# Altium footprint library connectors_socets.pcblib: 601 footprints (part 30 of 38)
Each footprint in its own frame and in the unit in brackets; x right, y up, seen from the top. Pads: shape width x height; smd on the part's side, far side on the other; paste and mask are expansions set on the pad; w line width, h text height; cw(c..) or ccw(c..) is an arc to the next point about the centre after c.
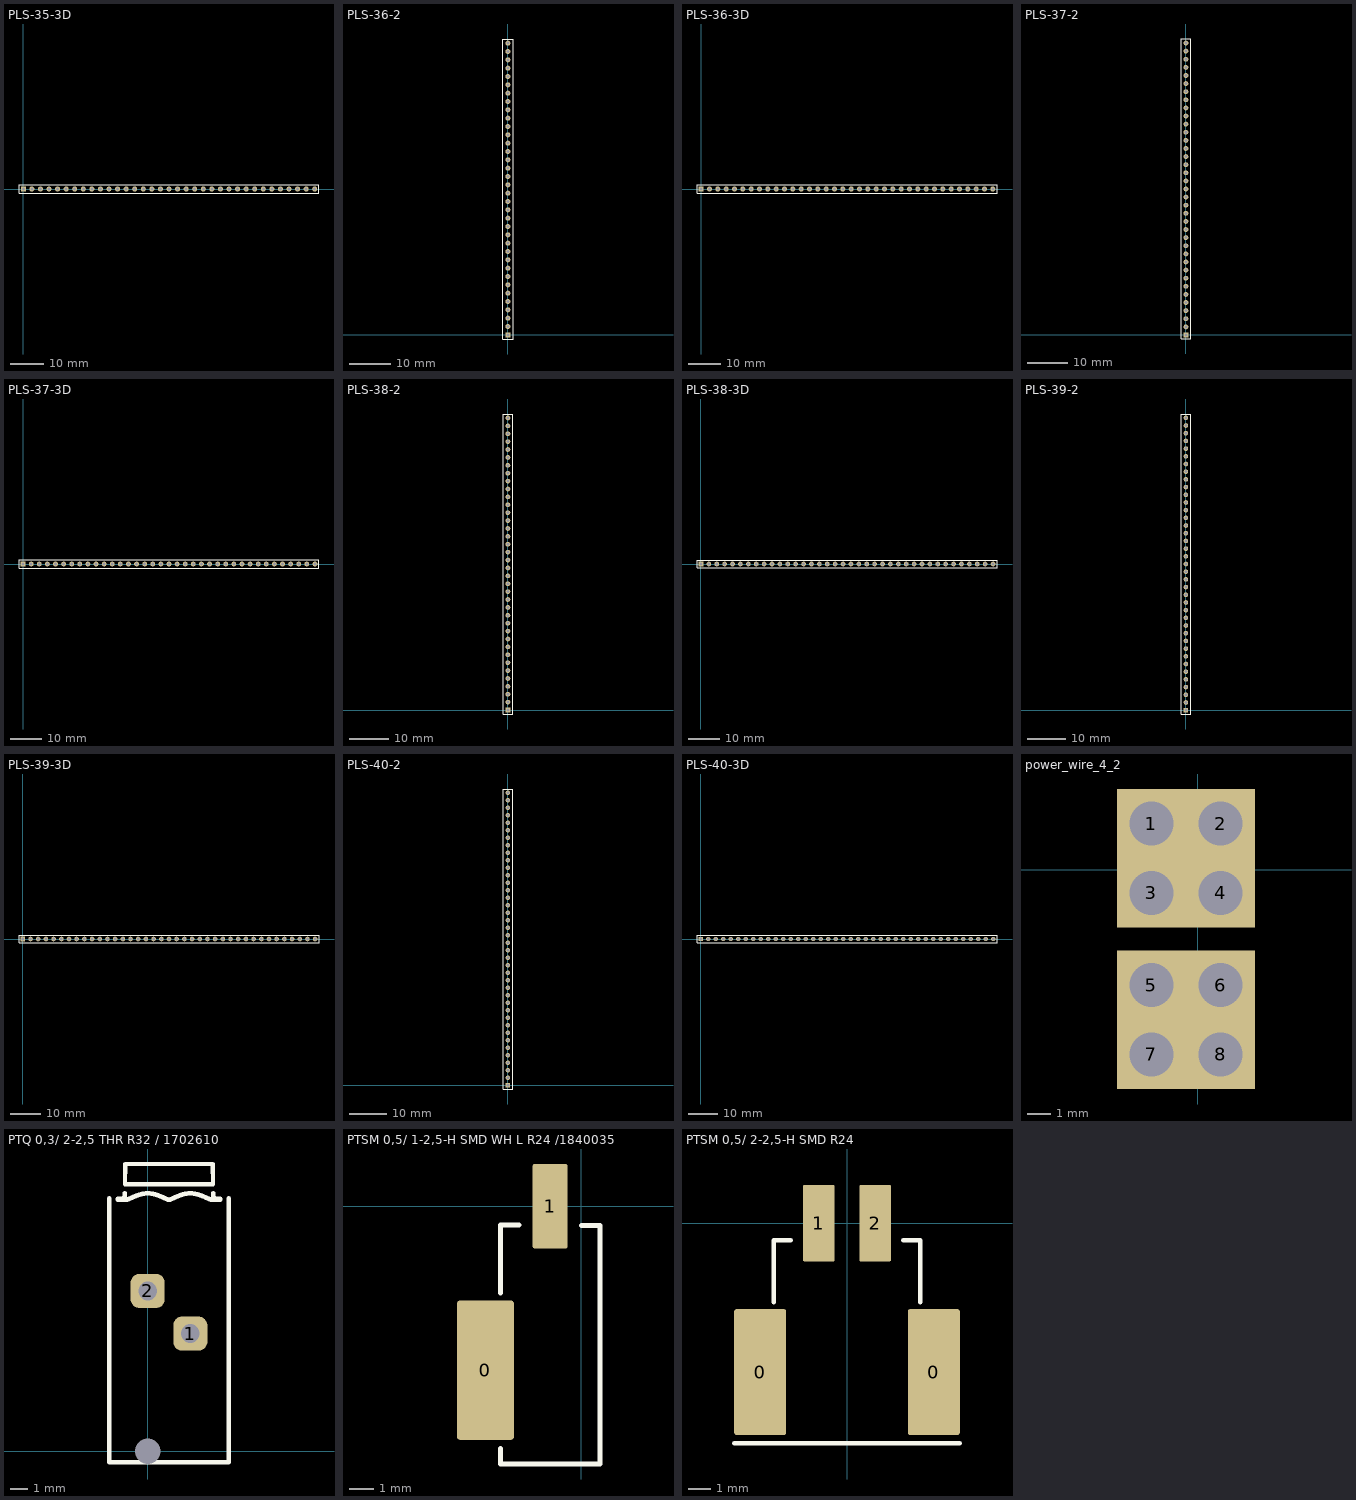
[diagram p29: the footprints below, top view; thin cyan lines are the x and y axes]

## PLS-35-3D [mm] "Connector; Header; 35 Position"
height 7.5
pads (35):
  rect 1.5x1.5 hole 0.9: 1(0,0)
  round 1.5 hole 0.9: 2(2.54,0) 3(5.08,0) 4(7.62,0) 5(10.16,0) 6(12.7,0) 7(15.24,0) 8(17.78,0) 9(20.32,0) 10(22.86,0) 11(25.4,0) 12(27.94,0) 13(30.48,0) 14(33.02,0) 15(35.56,0) 16(38.1,0) 17(40.64,0) 18(43.18,0) 19(45.72,0) 20(48.26,0) 21(50.8,0) 22(53.34,0) 23(55.88,0) 24(58.42,0) 25(60.96,0) 26(63.5,0) 27(66.04,0) 28(68.58,0) 29(71.12,0) 30(73.66,0) 31(76.2,0) 32(78.74,0) 33(81.28,0) 34(83.82,0) 35(86.36,0)
Top Overlay:
  lines w0.2: -1.27,-1.27 -1.27,1.27 87.63,1.27 87.63,-1.27 -1.27,-1.27
3D body "PLS-1.step": height 8.44, standoff -3, extent -1.27,-1.27 1.27,1.27
3D body "PLS-1.step": height 8.44, standoff -3, extent 1.27,-1.27 3.81,1.27
3D body "PLS-1.step": height 8.44, standoff -3, extent 3.81,-1.27 6.35,1.27
3D body "PLS-1.step": height 8.44, standoff -3, extent 6.35,-1.27 8.89,1.27
3D body "PLS-1.step": height 8.44, standoff -3, extent 8.89,-1.27 11.43,1.27
3D body "PLS-1.step": height 8.44, standoff -3, extent 11.43,-1.27 13.97,1.27
3D body "PLS-1.step": height 8.44, standoff -3, extent 13.97,-1.27 16.51,1.27
3D body "PLS-1.step": height 8.44, standoff -3, extent 16.51,-1.27 19.05,1.27
3D body "PLS-1.step": height 8.44, standoff -3, extent 19.05,-1.27 21.59,1.27
3D body "PLS-1.step": height 8.44, standoff -3, extent 21.59,-1.27 24.13,1.27
3D body "PLS-1.step": height 8.44, standoff -3, extent 24.13,-1.27 26.67,1.27
3D body "PLS-1.step": height 8.44, standoff -3, extent 26.67,-1.27 29.21,1.27
3D body "PLS-1.step": height 8.44, standoff -3, extent 29.21,-1.27 31.75,1.27
3D body "PLS-1.step": height 8.44, standoff -3, extent 31.75,-1.27 34.29,1.27
3D body "PLS-1.step": height 8.44, standoff -3, extent 34.29,-1.27 36.83,1.27
3D body "PLS-1.step": height 8.44, standoff -3, extent 36.83,-1.27 39.37,1.27
3D body "PLS-1.step": height 8.44, standoff -3, extent 39.37,-1.27 41.91,1.27
3D body "PLS-1.step": height 8.44, standoff -3, extent 41.91,-1.27 44.45,1.27
3D body "PLS-1.step": height 8.44, standoff -3, extent 44.45,-1.27 46.99,1.27
3D body "PLS-1.step": height 8.44, standoff -3, extent 46.99,-1.27 49.53,1.27
3D body "PLS-1.step": height 8.44, standoff -3, extent 49.53,-1.27 52.07,1.27
3D body "PLS-1.step": height 8.44, standoff -3, extent 52.07,-1.27 54.61,1.27
3D body "PLS-1.step": height 8.44, standoff -3, extent 54.61,-1.27 57.15,1.27
3D body "PLS-1.step": height 8.44, standoff -3, extent 57.15,-1.27 59.69,1.27
3D body "PLS-1.step": height 8.44, standoff -3, extent 59.69,-1.27 62.23,1.27
3D body "PLS-1.step": height 8.44, standoff -3, extent 62.23,-1.27 64.77,1.27
3D body "PLS-1.step": height 8.44, standoff -3, extent 64.77,-1.27 67.31,1.27
3D body "PLS-1.step": height 8.44, standoff -3, extent 67.31,-1.27 69.85,1.27
3D body "PLS-1.step": height 8.44, standoff -3, extent 69.85,-1.27 72.39,1.27
3D body "PLS-1.step": height 8.44, standoff -3, extent 72.39,-1.27 74.93,1.27
3D body "PLS-1.step": height 8.44, standoff -3, extent 74.93,-1.27 77.47,1.27
3D body "PLS-1.step": height 8.44, standoff -3, extent 77.47,-1.27 80.01,1.27
3D body "PLS-1.step": height 8.44, standoff -3, extent 80.01,-1.27 82.55,1.27
3D body "PLS-1.step": height 8.44, standoff -3, extent 82.55,-1.27 85.09,1.27
3D body "PLS-1.step": height 8.44, standoff -3, extent 85.09,-1.27 87.63,1.27

## PLS-36-2 [mm] "Connector; Header; 1x36 Position"
height 6
pads (36):
  rect 1.2x1.2 hole 0.75: 1(0,0)
  round 1.2 hole 0.75: 2(0,2) 3(0,4) 4(0,6) 5(0,8)
  round 1.2 hole 0.75 unplated: 6(0,10) 7(0,12) 8(0,14) 9(0,16) 10(0,18) 11(0,20) 12(0,22) 13(0,24) 14(0,26) 15(0,28) 16(0,30) 17(0,32) 18(0,34) 19(0,36) 20(0,38) 21(0,40) 22(0,42) 23(0,44) 24(0,46) 25(0,48) 26(0,50) 27(0,52) 28(0,54) 29(0,56) 30(0,58) 31(0,60) 32(0,62) 33(0,64) 34(0,66) 35(0,68) 36(0,70)
Top Overlay:
  lines w0.2: -1.2,-1 1.25,-1 1.25,71 -1.2,71 -1.2,-1
3D body "pls-2mm.stp": height 5.5, standoff -2.5, extent -1.2,7 1.2,9
3D body "pls-2mm.stp": height 5.5, standoff -2.5, extent -1.2,5 1.2,7
3D body "pls-2mm.stp": height 5.5, standoff -2.5, extent -1.2,3 1.2,5
3D body "pls-2mm.stp": height 5.5, standoff -2.5, extent -1.2,1 1.2,3
3D body "pls-2mm.stp": height 5.5, standoff -2.5, extent -1.2,-1 1.2,1
3D body "pls-2mm.stp": height 5.5, standoff -2.5, extent -1.2,9 1.2,11
3D body "pls-2mm.stp": height 5.5, standoff -2.5, extent -1.2,11 1.2,13
3D body "pls-2mm.stp": height 5.5, standoff -2.5, extent -1.2,13 1.2,15
3D body "pls-2mm.stp": height 5.5, standoff -2.5, extent -1.2,15 1.2,17
3D body "pls-2mm.stp": height 5.5, standoff -2.5, extent -1.2,17 1.2,19
3D body "pls-2mm.stp": height 5.5, standoff -2.5, extent -1.2,19 1.2,21
3D body "pls-2mm.stp": height 5.5, standoff -2.5, extent -1.2,21 1.2,23
3D body "pls-2mm.stp": height 5.5, standoff -2.5, extent -1.2,23 1.2,25
3D body "pls-2mm.stp": height 5.5, standoff -2.5, extent -1.2,25 1.2,27
3D body "pls-2mm.stp": height 5.5, standoff -2.5, extent -1.2,27 1.2,29
3D body "pls-2mm.stp": height 5.5, standoff -2.5, extent -1.2,29 1.2,31
3D body "pls-2mm.stp": height 5.5, standoff -2.5, extent -1.2,31 1.2,33
3D body "pls-2mm.stp": height 5.5, standoff -2.5, extent -1.2,33 1.2,35
3D body "pls-2mm.stp": height 5.5, standoff -2.5, extent -1.2,35 1.2,37
3D body "pls-2mm.stp": height 5.5, standoff -2.5, extent -1.2,37 1.2,39
3D body "pls-2mm.stp": height 5.5, standoff -2.5, extent -1.2,39 1.2,41
3D body "pls-2mm.stp": height 5.5, standoff -2.5, extent -1.2,41 1.2,43
3D body "pls-2mm.stp": height 5.5, standoff -2.5, extent -1.2,43 1.2,45
3D body "pls-2mm.stp": height 5.5, standoff -2.5, extent -1.2,45 1.2,47
3D body "pls-2mm.stp": height 5.5, standoff -2.5, extent -1.2,47 1.2,49
3D body "pls-2mm.stp": height 5.5, standoff -2.5, extent -1.2,49 1.2,51
3D body "pls-2mm.stp": height 5.5, standoff -2.5, extent -1.2,51 1.2,53
3D body "pls-2mm.stp": height 5.5, standoff -2.5, extent -1.2,53 1.2,55
3D body "pls-2mm.stp": height 5.5, standoff -2.5, extent -1.2,55 1.2,57
3D body "pls-2mm.stp": height 5.5, standoff -2.5, extent -1.2,57 1.2,59
3D body "pls-2mm.stp": height 5.5, standoff -2.5, extent -1.2,59 1.2,61
3D body "pls-2mm.stp": height 5.5, standoff -2.5, extent -1.2,61 1.2,63
3D body "pls-2mm.stp": height 5.5, standoff -2.5, extent -1.2,63 1.2,65
3D body "pls-2mm.stp": height 5.5, standoff -2.5, extent -1.2,65 1.2,67
3D body "pls-2mm.stp": height 5.5, standoff -2.5, extent -1.2,67 1.2,69
3D body "pls-2mm.stp": height 5.5, standoff -2.5, extent -1.2,69 1.2,71

## PLS-36-3D [mm] "Connector; Header; 36 Position"
height 7.5
pads (36):
  rect 1.5x1.5 hole 0.9: 1(0,0)
  round 1.5 hole 0.9: 2(2.54,0) 3(5.08,0) 4(7.62,0) 5(10.16,0) 6(12.7,0) 7(15.24,0) 8(17.78,0) 9(20.32,0) 10(22.86,0) 11(25.4,0) 12(27.94,0) 13(30.48,0) 14(33.02,0) 15(35.56,0) 16(38.1,0) 17(40.64,0) 18(43.18,0) 19(45.72,0) 20(48.26,0) 21(50.8,0) 22(53.34,0) 23(55.88,0) 24(58.42,0) 25(60.96,0) 26(63.5,0) 27(66.04,0) 28(68.58,0) 29(71.12,0) 30(73.66,0) 31(76.2,0) 32(78.74,0) 33(81.28,0) 34(83.82,0) 35(86.36,0) 36(88.9,0)
Top Overlay:
  lines w0.2: -1.27,-1.27 90.17,-1.27 90.17,1.27 -1.27,1.27 -1.27,-1.27
3D body "PLS-1.step": height 8.44, standoff -3, extent 87.63,-1.27 90.17,1.27
3D body "PLS-1.step": height 8.44, standoff -3, extent -1.27,-1.27 1.27,1.27
3D body "PLS-1.step": height 8.44, standoff -3, extent 1.27,-1.27 3.81,1.27
3D body "PLS-1.step": height 8.44, standoff -3, extent 3.81,-1.27 6.35,1.27
3D body "PLS-1.step": height 8.44, standoff -3, extent 6.35,-1.27 8.89,1.27
3D body "PLS-1.step": height 8.44, standoff -3, extent 8.89,-1.27 11.43,1.27
3D body "PLS-1.step": height 8.44, standoff -3, extent 11.43,-1.27 13.97,1.27
3D body "PLS-1.step": height 8.44, standoff -3, extent 13.97,-1.27 16.51,1.27
3D body "PLS-1.step": height 8.44, standoff -3, extent 16.51,-1.27 19.05,1.27
3D body "PLS-1.step": height 8.44, standoff -3, extent 19.05,-1.27 21.59,1.27
3D body "PLS-1.step": height 8.44, standoff -3, extent 21.59,-1.27 24.13,1.27
3D body "PLS-1.step": height 8.44, standoff -3, extent 24.13,-1.27 26.67,1.27
3D body "PLS-1.step": height 8.44, standoff -3, extent 26.67,-1.27 29.21,1.27
3D body "PLS-1.step": height 8.44, standoff -3, extent 29.21,-1.27 31.75,1.27
3D body "PLS-1.step": height 8.44, standoff -3, extent 31.75,-1.27 34.29,1.27
3D body "PLS-1.step": height 8.44, standoff -3, extent 34.29,-1.27 36.83,1.27
3D body "PLS-1.step": height 8.44, standoff -3, extent 36.83,-1.27 39.37,1.27
3D body "PLS-1.step": height 8.44, standoff -3, extent 39.37,-1.27 41.91,1.27
3D body "PLS-1.step": height 8.44, standoff -3, extent 41.91,-1.27 44.45,1.27
3D body "PLS-1.step": height 8.44, standoff -3, extent 44.45,-1.27 46.99,1.27
3D body "PLS-1.step": height 8.44, standoff -3, extent 46.99,-1.27 49.53,1.27
3D body "PLS-1.step": height 8.44, standoff -3, extent 49.53,-1.27 52.07,1.27
3D body "PLS-1.step": height 8.44, standoff -3, extent 52.07,-1.27 54.61,1.27
3D body "PLS-1.step": height 8.44, standoff -3, extent 54.61,-1.27 57.15,1.27
3D body "PLS-1.step": height 8.44, standoff -3, extent 57.15,-1.27 59.69,1.27
3D body "PLS-1.step": height 8.44, standoff -3, extent 59.69,-1.27 62.23,1.27
3D body "PLS-1.step": height 8.44, standoff -3, extent 62.23,-1.27 64.77,1.27
3D body "PLS-1.step": height 8.44, standoff -3, extent 64.77,-1.27 67.31,1.27
3D body "PLS-1.step": height 8.44, standoff -3, extent 67.31,-1.27 69.85,1.27
3D body "PLS-1.step": height 8.44, standoff -3, extent 69.85,-1.27 72.39,1.27
3D body "PLS-1.step": height 8.44, standoff -3, extent 72.39,-1.27 74.93,1.27
3D body "PLS-1.step": height 8.44, standoff -3, extent 74.93,-1.27 77.47,1.27
3D body "PLS-1.step": height 8.44, standoff -3, extent 77.47,-1.27 80.01,1.27
3D body "PLS-1.step": height 8.44, standoff -3, extent 80.01,-1.27 82.55,1.27
3D body "PLS-1.step": height 8.44, standoff -3, extent 82.55,-1.27 85.09,1.27
3D body "PLS-1.step": height 8.44, standoff -3, extent 85.09,-1.27 87.63,1.27

## PLS-37-2 [mm] "Connector; Header; 1x37 Position"
height 6
pads (37):
  rect 1.2x1.2 hole 0.75: 1(0,0)
  round 1.2 hole 0.75: 2(0,2) 3(0,4) 4(0,6) 5(0,8)
  round 1.2 hole 0.75 unplated: 6(0,10) 7(0,12) 8(0,14) 9(0,16) 10(0,18) 11(0,20) 12(0,22) 13(0,24) 14(0,26) 15(0,28) 16(0,30) 17(0,32) 18(0,34) 19(0,36) 20(0,38) 21(0,40) 22(0,42) 23(0,44) 24(0,46) 25(0,48) 26(0,50) 27(0,52) 28(0,54) 29(0,56) 30(0,58) 31(0,60) 32(0,62) 33(0,64) 34(0,66) 35(0,68) 36(0,70) 37(0,72)
Top Overlay:
  lines w0.2: -1.2,-1 1.25,-1 1.25,73 -1.2,73 -1.2,-1
3D body "pls-2mm.stp": height 5.5, standoff -2.5, extent -1.2,7 1.2,9
3D body "pls-2mm.stp": height 5.5, standoff -2.5, extent -1.2,5 1.2,7
3D body "pls-2mm.stp": height 5.5, standoff -2.5, extent -1.2,3 1.2,5
3D body "pls-2mm.stp": height 5.5, standoff -2.5, extent -1.2,1 1.2,3
3D body "pls-2mm.stp": height 5.5, standoff -2.5, extent -1.2,-1 1.2,1
3D body "pls-2mm.stp": height 5.5, standoff -2.5, extent -1.2,9 1.2,11
3D body "pls-2mm.stp": height 5.5, standoff -2.5, extent -1.2,11 1.2,13
3D body "pls-2mm.stp": height 5.5, standoff -2.5, extent -1.2,13 1.2,15
3D body "pls-2mm.stp": height 5.5, standoff -2.5, extent -1.2,15 1.2,17
3D body "pls-2mm.stp": height 5.5, standoff -2.5, extent -1.2,17 1.2,19
3D body "pls-2mm.stp": height 5.5, standoff -2.5, extent -1.2,19 1.2,21
3D body "pls-2mm.stp": height 5.5, standoff -2.5, extent -1.2,21 1.2,23
3D body "pls-2mm.stp": height 5.5, standoff -2.5, extent -1.2,23 1.2,25
3D body "pls-2mm.stp": height 5.5, standoff -2.5, extent -1.2,25 1.2,27
3D body "pls-2mm.stp": height 5.5, standoff -2.5, extent -1.2,27 1.2,29
3D body "pls-2mm.stp": height 5.5, standoff -2.5, extent -1.2,29 1.2,31
3D body "pls-2mm.stp": height 5.5, standoff -2.5, extent -1.2,31 1.2,33
3D body "pls-2mm.stp": height 5.5, standoff -2.5, extent -1.2,33 1.2,35
3D body "pls-2mm.stp": height 5.5, standoff -2.5, extent -1.2,35 1.2,37
3D body "pls-2mm.stp": height 5.5, standoff -2.5, extent -1.2,37 1.2,39
3D body "pls-2mm.stp": height 5.5, standoff -2.5, extent -1.2,39 1.2,41
3D body "pls-2mm.stp": height 5.5, standoff -2.5, extent -1.2,41 1.2,43
3D body "pls-2mm.stp": height 5.5, standoff -2.5, extent -1.2,43 1.2,45
3D body "pls-2mm.stp": height 5.5, standoff -2.5, extent -1.2,45 1.2,47
3D body "pls-2mm.stp": height 5.5, standoff -2.5, extent -1.2,47 1.2,49
3D body "pls-2mm.stp": height 5.5, standoff -2.5, extent -1.2,49 1.2,51
3D body "pls-2mm.stp": height 5.5, standoff -2.5, extent -1.2,51 1.2,53
3D body "pls-2mm.stp": height 5.5, standoff -2.5, extent -1.2,53 1.2,55
3D body "pls-2mm.stp": height 5.5, standoff -2.5, extent -1.2,55 1.2,57
3D body "pls-2mm.stp": height 5.5, standoff -2.5, extent -1.2,57 1.2,59
3D body "pls-2mm.stp": height 5.5, standoff -2.5, extent -1.2,59 1.2,61
3D body "pls-2mm.stp": height 5.5, standoff -2.5, extent -1.2,61 1.2,63
3D body "pls-2mm.stp": height 5.5, standoff -2.5, extent -1.2,63 1.2,65
3D body "pls-2mm.stp": height 5.5, standoff -2.5, extent -1.2,65 1.2,67
3D body "pls-2mm.stp": height 5.5, standoff -2.5, extent -1.2,67 1.2,69
3D body "pls-2mm.stp": height 5.5, standoff -2.5, extent -1.2,69 1.2,71
3D body "pls-2mm.stp": height 5.5, standoff -2.5, extent -1.2,71 1.2,73

## PLS-37-3D [mm] "Connector; Header; 37 Position"
height 7.5
pads (37):
  rect 1.5x1.5 hole 0.9: 1(0,0)
  round 1.5 hole 0.9: 2(2.54,0) 3(5.08,0) 4(7.62,0) 5(10.16,0) 6(12.7,0) 7(15.24,0) 8(17.78,0) 9(20.32,0) 10(22.86,0) 11(25.4,0) 12(27.94,0) 13(30.48,0) 14(33.02,0) 15(35.56,0) 16(38.1,0) 17(40.64,0) 18(43.18,0) 19(45.72,0) 20(48.26,0) 21(50.8,0) 22(53.34,0) 23(55.88,0) 24(58.42,0) 25(60.96,0) 26(63.5,0) 27(66.04,0) 28(68.58,0) 29(71.12,0) 30(73.66,0) 31(76.2,0) 32(78.74,0) 33(81.28,0) 34(83.82,0) 35(86.36,0) 36(88.9,0) 37(91.44,0)
Top Overlay:
  lines w0.2: -1.27,-1.27 92.71,-1.27 92.71,1.27 -1.27,1.27 -1.27,-1.27
3D body "PLS-1.step": height 8.44, standoff -3, extent 90.17,-1.27 92.71,1.27
3D body "PLS-1.step": height 8.44, standoff -3, extent 87.63,-1.27 90.17,1.27
3D body "PLS-1.step": height 8.44, standoff -3, extent 85.09,-1.27 87.63,1.27
3D body "PLS-1.step": height 8.44, standoff -3, extent 82.55,-1.27 85.09,1.27
3D body "PLS-1.step": height 8.44, standoff -3, extent 80.01,-1.27 82.55,1.27
3D body "PLS-1.step": height 8.44, standoff -3, extent 77.47,-1.27 80.01,1.27
3D body "PLS-1.step": height 8.44, standoff -3, extent 74.93,-1.27 77.47,1.27
3D body "PLS-1.step": height 8.44, standoff -3, extent 72.39,-1.27 74.93,1.27
3D body "PLS-1.step": height 8.44, standoff -3, extent 69.85,-1.27 72.39,1.27
3D body "PLS-1.step": height 8.44, standoff -3, extent 67.31,-1.27 69.85,1.27
3D body "PLS-1.step": height 8.44, standoff -3, extent 64.77,-1.27 67.31,1.27
3D body "PLS-1.step": height 8.44, standoff -3, extent 62.23,-1.27 64.77,1.27
3D body "PLS-1.step": height 8.44, standoff -3, extent 59.69,-1.27 62.23,1.27
3D body "PLS-1.step": height 8.44, standoff -3, extent 57.15,-1.27 59.69,1.27
3D body "PLS-1.step": height 8.44, standoff -3, extent 54.61,-1.27 57.15,1.27
3D body "PLS-1.step": height 8.44, standoff -3, extent 52.07,-1.27 54.61,1.27
3D body "PLS-1.step": height 8.44, standoff -3, extent 49.53,-1.27 52.07,1.27
3D body "PLS-1.step": height 8.44, standoff -3, extent 46.99,-1.27 49.53,1.27
3D body "PLS-1.step": height 8.44, standoff -3, extent 44.45,-1.27 46.99,1.27
3D body "PLS-1.step": height 8.44, standoff -3, extent 41.91,-1.27 44.45,1.27
3D body "PLS-1.step": height 8.44, standoff -3, extent 39.37,-1.27 41.91,1.27
3D body "PLS-1.step": height 8.44, standoff -3, extent 36.83,-1.27 39.37,1.27
3D body "PLS-1.step": height 8.44, standoff -3, extent 34.29,-1.27 36.83,1.27
3D body "PLS-1.step": height 8.44, standoff -3, extent 31.75,-1.27 34.29,1.27
3D body "PLS-1.step": height 8.44, standoff -3, extent 29.21,-1.27 31.75,1.27
3D body "PLS-1.step": height 8.44, standoff -3, extent 26.67,-1.27 29.21,1.27
3D body "PLS-1.step": height 8.44, standoff -3, extent 24.13,-1.27 26.67,1.27
3D body "PLS-1.step": height 8.44, standoff -3, extent 21.59,-1.27 24.13,1.27
3D body "PLS-1.step": height 8.44, standoff -3, extent 19.05,-1.27 21.59,1.27
3D body "PLS-1.step": height 8.44, standoff -3, extent 16.51,-1.27 19.05,1.27
3D body "PLS-1.step": height 8.44, standoff -3, extent 13.97,-1.27 16.51,1.27
3D body "PLS-1.step": height 8.44, standoff -3, extent 11.43,-1.27 13.97,1.27
3D body "PLS-1.step": height 8.44, standoff -3, extent 8.89,-1.27 11.43,1.27
3D body "PLS-1.step": height 8.44, standoff -3, extent 6.35,-1.27 8.89,1.27
3D body "PLS-1.step": height 8.44, standoff -3, extent 3.81,-1.27 6.35,1.27
3D body "PLS-1.step": height 8.44, standoff -3, extent 1.27,-1.27 3.81,1.27
3D body "PLS-1.step": height 8.44, standoff -3, extent -1.27,-1.27 1.27,1.27

## PLS-38-2 [mm] "Connector; Header; 1x38 Position"
height 6
pads (38):
  rect 1.2x1.2 hole 0.75: 1(0,0)
  round 1.2 hole 0.75: 2(0,2) 3(0,4) 4(0,6) 5(0,8)
  round 1.2 hole 0.75 unplated: 6(0,10) 7(0,12) 8(0,14) 9(0,16) 10(0,18) 11(0,20) 12(0,22) 13(0,24) 14(0,26) 15(0,28) 16(0,30) 17(0,32) 18(0,34) 19(0,36) 20(0,38) 21(0,40) 22(0,42) 23(0,44) 24(0,46) 25(0,48) 26(0,50) 27(0,52) 28(0,54) 29(0,56) 30(0,58) 31(0,60) 32(0,62) 33(0,64) 34(0,66) 35(0,68) 36(0,70) 37(0,72) 38(0,74)
Top Overlay:
  lines w0.2: -1.2,-1 -1.2,75 1.25,75 1.25,-1 -1.2,-1
3D body "pls-2mm.stp": height 5.5, standoff -2.5, extent -1.2,73 1.2,75
3D body "pls-2mm.stp": height 5.5, standoff -2.5, extent -1.2,71 1.2,73
3D body "pls-2mm.stp": height 5.5, standoff -2.5, extent -1.2,69 1.2,71
3D body "pls-2mm.stp": height 5.5, standoff -2.5, extent -1.2,67 1.2,69
3D body "pls-2mm.stp": height 5.5, standoff -2.5, extent -1.2,65 1.2,67
3D body "pls-2mm.stp": height 5.5, standoff -2.5, extent -1.2,63 1.2,65
3D body "pls-2mm.stp": height 5.5, standoff -2.5, extent -1.2,61 1.2,63
3D body "pls-2mm.stp": height 5.5, standoff -2.5, extent -1.2,59 1.2,61
3D body "pls-2mm.stp": height 5.5, standoff -2.5, extent -1.2,57 1.2,59
3D body "pls-2mm.stp": height 5.5, standoff -2.5, extent -1.2,55 1.2,57
3D body "pls-2mm.stp": height 5.5, standoff -2.5, extent -1.2,53 1.2,55
3D body "pls-2mm.stp": height 5.5, standoff -2.5, extent -1.2,51 1.2,53
3D body "pls-2mm.stp": height 5.5, standoff -2.5, extent -1.2,49 1.2,51
3D body "pls-2mm.stp": height 5.5, standoff -2.5, extent -1.2,47 1.2,49
3D body "pls-2mm.stp": height 5.5, standoff -2.5, extent -1.2,45 1.2,47
3D body "pls-2mm.stp": height 5.5, standoff -2.5, extent -1.2,43 1.2,45
3D body "pls-2mm.stp": height 5.5, standoff -2.5, extent -1.2,41 1.2,43
3D body "pls-2mm.stp": height 5.5, standoff -2.5, extent -1.2,39 1.2,41
3D body "pls-2mm.stp": height 5.5, standoff -2.5, extent -1.2,37 1.2,39
3D body "pls-2mm.stp": height 5.5, standoff -2.5, extent -1.2,35 1.2,37
3D body "pls-2mm.stp": height 5.5, standoff -2.5, extent -1.2,33 1.2,35
3D body "pls-2mm.stp": height 5.5, standoff -2.5, extent -1.2,31 1.2,33
3D body "pls-2mm.stp": height 5.5, standoff -2.5, extent -1.2,29 1.2,31
3D body "pls-2mm.stp": height 5.5, standoff -2.5, extent -1.2,27 1.2,29
3D body "pls-2mm.stp": height 5.5, standoff -2.5, extent -1.2,25 1.2,27
3D body "pls-2mm.stp": height 5.5, standoff -2.5, extent -1.2,23 1.2,25
3D body "pls-2mm.stp": height 5.5, standoff -2.5, extent -1.2,21 1.2,23
3D body "pls-2mm.stp": height 5.5, standoff -2.5, extent -1.2,19 1.2,21
3D body "pls-2mm.stp": height 5.5, standoff -2.5, extent -1.2,17 1.2,19
3D body "pls-2mm.stp": height 5.5, standoff -2.5, extent -1.2,15 1.2,17
3D body "pls-2mm.stp": height 5.5, standoff -2.5, extent -1.2,13 1.2,15
3D body "pls-2mm.stp": height 5.5, standoff -2.5, extent -1.2,11 1.2,13
3D body "pls-2mm.stp": height 5.5, standoff -2.5, extent -1.2,9 1.2,11
3D body "pls-2mm.stp": height 5.5, standoff -2.5, extent -1.2,-1 1.2,1
3D body "pls-2mm.stp": height 5.5, standoff -2.5, extent -1.2,1 1.2,3
3D body "pls-2mm.stp": height 5.5, standoff -2.5, extent -1.2,3 1.2,5
3D body "pls-2mm.stp": height 5.5, standoff -2.5, extent -1.2,5 1.2,7
3D body "pls-2mm.stp": height 5.5, standoff -2.5, extent -1.2,7 1.2,9

## PLS-38-3D [mm] "Connector; Header; 38 Position"
height 7.5
pads (38):
  rect 1.5x1.5 hole 0.9: 1(0,0)
  round 1.5 hole 0.9: 2(2.54,0) 3(5.08,0) 4(7.62,0) 5(10.16,0) 6(12.7,0) 7(15.24,0) 8(17.78,0) 9(20.32,0) 10(22.86,0) 11(25.4,0) 12(27.94,0) 13(30.48,0) 14(33.02,0) 15(35.56,0) 16(38.1,0) 17(40.64,0) 18(43.18,0) 19(45.72,0) 20(48.26,0) 21(50.8,0) 22(53.34,0) 23(55.88,0) 24(58.42,0) 25(60.96,0) 26(63.5,0) 27(66.04,0) 28(68.58,0) 29(71.12,0) 30(73.66,0) 31(76.2,0) 32(78.74,0) 33(81.28,0) 34(83.82,0) 35(86.36,0) 36(88.9,0) 37(91.44,0) 38(93.98,0)
Top Overlay:
  lines w0.2: -1.27,-1.27 -1.27,1.27 95.25,1.27 95.25,-1.27 -1.27,-1.27
3D body "PLS-1.step": height 8.44, standoff -3, extent 92.71,-1.27 95.25,1.27
3D body "PLS-1.step": height 8.44, standoff -3, extent 90.17,-1.27 92.71,1.27
3D body "PLS-1.step": height 8.44, standoff -3, extent 87.63,-1.27 90.17,1.27
3D body "PLS-1.step": height 8.44, standoff -3, extent -1.27,-1.27 1.27,1.27
3D body "PLS-1.step": height 8.44, standoff -3, extent 1.27,-1.27 3.81,1.27
3D body "PLS-1.step": height 8.44, standoff -3, extent 3.81,-1.27 6.35,1.27
3D body "PLS-1.step": height 8.44, standoff -3, extent 6.35,-1.27 8.89,1.27
3D body "PLS-1.step": height 8.44, standoff -3, extent 8.89,-1.27 11.43,1.27
3D body "PLS-1.step": height 8.44, standoff -3, extent 11.43,-1.27 13.97,1.27
3D body "PLS-1.step": height 8.44, standoff -3, extent 13.97,-1.27 16.51,1.27
3D body "PLS-1.step": height 8.44, standoff -3, extent 16.51,-1.27 19.05,1.27
3D body "PLS-1.step": height 8.44, standoff -3, extent 19.05,-1.27 21.59,1.27
3D body "PLS-1.step": height 8.44, standoff -3, extent 21.59,-1.27 24.13,1.27
3D body "PLS-1.step": height 8.44, standoff -3, extent 24.13,-1.27 26.67,1.27
3D body "PLS-1.step": height 8.44, standoff -3, extent 26.67,-1.27 29.21,1.27
3D body "PLS-1.step": height 8.44, standoff -3, extent 29.21,-1.27 31.75,1.27
3D body "PLS-1.step": height 8.44, standoff -3, extent 31.75,-1.27 34.29,1.27
3D body "PLS-1.step": height 8.44, standoff -3, extent 34.29,-1.27 36.83,1.27
3D body "PLS-1.step": height 8.44, standoff -3, extent 36.83,-1.27 39.37,1.27
3D body "PLS-1.step": height 8.44, standoff -3, extent 39.37,-1.27 41.91,1.27
3D body "PLS-1.step": height 8.44, standoff -3, extent 41.91,-1.27 44.45,1.27
3D body "PLS-1.step": height 8.44, standoff -3, extent 44.45,-1.27 46.99,1.27
3D body "PLS-1.step": height 8.44, standoff -3, extent 46.99,-1.27 49.53,1.27
3D body "PLS-1.step": height 8.44, standoff -3, extent 49.53,-1.27 52.07,1.27
3D body "PLS-1.step": height 8.44, standoff -3, extent 52.07,-1.27 54.61,1.27
3D body "PLS-1.step": height 8.44, standoff -3, extent 54.61,-1.27 57.15,1.27
3D body "PLS-1.step": height 8.44, standoff -3, extent 57.15,-1.27 59.69,1.27
3D body "PLS-1.step": height 8.44, standoff -3, extent 59.69,-1.27 62.23,1.27
3D body "PLS-1.step": height 8.44, standoff -3, extent 62.23,-1.27 64.77,1.27
3D body "PLS-1.step": height 8.44, standoff -3, extent 64.77,-1.27 67.31,1.27
3D body "PLS-1.step": height 8.44, standoff -3, extent 67.31,-1.27 69.85,1.27
3D body "PLS-1.step": height 8.44, standoff -3, extent 69.85,-1.27 72.39,1.27
3D body "PLS-1.step": height 8.44, standoff -3, extent 72.39,-1.27 74.93,1.27
3D body "PLS-1.step": height 8.44, standoff -3, extent 74.93,-1.27 77.47,1.27
3D body "PLS-1.step": height 8.44, standoff -3, extent 77.47,-1.27 80.01,1.27
3D body "PLS-1.step": height 8.44, standoff -3, extent 80.01,-1.27 82.55,1.27
3D body "PLS-1.step": height 8.44, standoff -3, extent 82.55,-1.27 85.09,1.27
3D body "PLS-1.step": height 8.44, standoff -3, extent 85.09,-1.27 87.63,1.27

## PLS-39-2 [mm] "Connector; Header; 1x39 Position"
height 6
pads (39):
  rect 1.2x1.2 hole 0.75: 1(0,0)
  round 1.2 hole 0.75: 2(0,2) 3(0,4) 4(0,6) 5(0,8)
  round 1.2 hole 0.75 unplated: 6(0,10) 7(0,12) 8(0,14) 9(0,16) 10(0,18) 11(0,20) 12(0,22) 13(0,24) 14(0,26) 15(0,28) 16(0,30) 17(0,32) 18(0,34) 19(0,36) 20(0,38) 21(0,40) 22(0,42) 23(0,44) 24(0,46) 25(0,48) 26(0,50) 27(0,52) 28(0,54) 29(0,56) 30(0,58) 31(0,60) 32(0,62) 33(0,64) 34(0,66) 35(0,68) 36(0,70) 37(0,72) 38(0,74) 39(0,76)
Top Overlay:
  lines w0.2: -1.2,-1 -1.2,77 1.25,77 1.25,-1 -1.2,-1
3D body "pls-2mm.stp": height 5.5, standoff -2.5, extent -1.2,75 1.2,77
3D body "pls-2mm.stp": height 5.5, standoff -2.5, extent -1.2,73 1.2,75
3D body "pls-2mm.stp": height 5.5, standoff -2.5, extent -1.2,71 1.2,73
3D body "pls-2mm.stp": height 5.5, standoff -2.5, extent -1.2,69 1.2,71
3D body "pls-2mm.stp": height 5.5, standoff -2.5, extent -1.2,67 1.2,69
3D body "pls-2mm.stp": height 5.5, standoff -2.5, extent -1.2,65 1.2,67
3D body "pls-2mm.stp": height 5.5, standoff -2.5, extent -1.2,63 1.2,65
3D body "pls-2mm.stp": height 5.5, standoff -2.5, extent -1.2,61 1.2,63
3D body "pls-2mm.stp": height 5.5, standoff -2.5, extent -1.2,59 1.2,61
3D body "pls-2mm.stp": height 5.5, standoff -2.5, extent -1.2,57 1.2,59
3D body "pls-2mm.stp": height 5.5, standoff -2.5, extent -1.2,55 1.2,57
3D body "pls-2mm.stp": height 5.5, standoff -2.5, extent -1.2,53 1.2,55
3D body "pls-2mm.stp": height 5.5, standoff -2.5, extent -1.2,51 1.2,53
3D body "pls-2mm.stp": height 5.5, standoff -2.5, extent -1.2,49 1.2,51
3D body "pls-2mm.stp": height 5.5, standoff -2.5, extent -1.2,47 1.2,49
3D body "pls-2mm.stp": height 5.5, standoff -2.5, extent -1.2,45 1.2,47
3D body "pls-2mm.stp": height 5.5, standoff -2.5, extent -1.2,43 1.2,45
3D body "pls-2mm.stp": height 5.5, standoff -2.5, extent -1.2,41 1.2,43
3D body "pls-2mm.stp": height 5.5, standoff -2.5, extent -1.2,39 1.2,41
3D body "pls-2mm.stp": height 5.5, standoff -2.5, extent -1.2,37 1.2,39
3D body "pls-2mm.stp": height 5.5, standoff -2.5, extent -1.2,35 1.2,37
3D body "pls-2mm.stp": height 5.5, standoff -2.5, extent -1.2,33 1.2,35
3D body "pls-2mm.stp": height 5.5, standoff -2.5, extent -1.2,31 1.2,33
3D body "pls-2mm.stp": height 5.5, standoff -2.5, extent -1.2,29 1.2,31
3D body "pls-2mm.stp": height 5.5, standoff -2.5, extent -1.2,27 1.2,29
3D body "pls-2mm.stp": height 5.5, standoff -2.5, extent -1.2,25 1.2,27
3D body "pls-2mm.stp": height 5.5, standoff -2.5, extent -1.2,23 1.2,25
3D body "pls-2mm.stp": height 5.5, standoff -2.5, extent -1.2,21 1.2,23
3D body "pls-2mm.stp": height 5.5, standoff -2.5, extent -1.2,19 1.2,21
3D body "pls-2mm.stp": height 5.5, standoff -2.5, extent -1.2,17 1.2,19
3D body "pls-2mm.stp": height 5.5, standoff -2.5, extent -1.2,15 1.2,17
3D body "pls-2mm.stp": height 5.5, standoff -2.5, extent -1.2,13 1.2,15
3D body "pls-2mm.stp": height 5.5, standoff -2.5, extent -1.2,11 1.2,13
3D body "pls-2mm.stp": height 5.5, standoff -2.5, extent -1.2,9 1.2,11
3D body "pls-2mm.stp": height 5.5, standoff -2.5, extent -1.2,-1 1.2,1
3D body "pls-2mm.stp": height 5.5, standoff -2.5, extent -1.2,1 1.2,3
3D body "pls-2mm.stp": height 5.5, standoff -2.5, extent -1.2,3 1.2,5
3D body "pls-2mm.stp": height 5.5, standoff -2.5, extent -1.2,5 1.2,7
3D body "pls-2mm.stp": height 5.5, standoff -2.5, extent -1.2,7 1.2,9

## PLS-39-3D [mm] "Connector; Header; 39 Position"
height 7.5
pads (39):
  rect 1.5x1.5 hole 0.9: 1(0,0)
  round 1.5 hole 0.9: 2(2.54,0) 3(5.08,0) 4(7.62,0) 5(10.16,0) 6(12.7,0) 7(15.24,0) 8(17.78,0) 9(20.32,0) 10(22.86,0) 11(25.4,0) 12(27.94,0) 13(30.48,0) 14(33.02,0) 15(35.56,0) 16(38.1,0) 17(40.64,0) 18(43.18,0) 19(45.72,0) 20(48.26,0) 21(50.8,0) 22(53.34,0) 23(55.88,0) 24(58.42,0) 25(60.96,0) 26(63.5,0) 27(66.04,0) 28(68.58,0) 29(71.12,0) 30(73.66,0) 31(76.2,0) 32(78.74,0) 33(81.28,0) 34(83.82,0) 35(86.36,0) 36(88.9,0) 37(91.44,0) 38(93.98,0) 39(96.52,0)
Top Overlay:
  lines w0.2: -1.27,-1.27 -1.27,1.27 97.79,1.27 97.79,-1.27 -1.27,-1.27
3D body "PLS-1.step": height 8.44, standoff -3, extent 95.25,-1.27 97.79,1.27
3D body "PLS-1.step": height 8.44, standoff -3, extent 92.71,-1.27 95.25,1.27
3D body "PLS-1.step": height 8.44, standoff -3, extent 90.17,-1.27 92.71,1.27
3D body "PLS-1.step": height 8.44, standoff -3, extent 87.63,-1.27 90.17,1.27
3D body "PLS-1.step": height 8.44, standoff -3, extent -1.27,-1.27 1.27,1.27
3D body "PLS-1.step": height 8.44, standoff -3, extent 1.27,-1.27 3.81,1.27
3D body "PLS-1.step": height 8.44, standoff -3, extent 3.81,-1.27 6.35,1.27
3D body "PLS-1.step": height 8.44, standoff -3, extent 6.35,-1.27 8.89,1.27
3D body "PLS-1.step": height 8.44, standoff -3, extent 8.89,-1.27 11.43,1.27
3D body "PLS-1.step": height 8.44, standoff -3, extent 11.43,-1.27 13.97,1.27
3D body "PLS-1.step": height 8.44, standoff -3, extent 13.97,-1.27 16.51,1.27
3D body "PLS-1.step": height 8.44, standoff -3, extent 16.51,-1.27 19.05,1.27
3D body "PLS-1.step": height 8.44, standoff -3, extent 19.05,-1.27 21.59,1.27
3D body "PLS-1.step": height 8.44, standoff -3, extent 21.59,-1.27 24.13,1.27
3D body "PLS-1.step": height 8.44, standoff -3, extent 24.13,-1.27 26.67,1.27
3D body "PLS-1.step": height 8.44, standoff -3, extent 26.67,-1.27 29.21,1.27
3D body "PLS-1.step": height 8.44, standoff -3, extent 29.21,-1.27 31.75,1.27
3D body "PLS-1.step": height 8.44, standoff -3, extent 31.75,-1.27 34.29,1.27
3D body "PLS-1.step": height 8.44, standoff -3, extent 34.29,-1.27 36.83,1.27
3D body "PLS-1.step": height 8.44, standoff -3, extent 36.83,-1.27 39.37,1.27
3D body "PLS-1.step": height 8.44, standoff -3, extent 39.37,-1.27 41.91,1.27
3D body "PLS-1.step": height 8.44, standoff -3, extent 41.91,-1.27 44.45,1.27
3D body "PLS-1.step": height 8.44, standoff -3, extent 44.45,-1.27 46.99,1.27
3D body "PLS-1.step": height 8.44, standoff -3, extent 46.99,-1.27 49.53,1.27
3D body "PLS-1.step": height 8.44, standoff -3, extent 49.53,-1.27 52.07,1.27
3D body "PLS-1.step": height 8.44, standoff -3, extent 52.07,-1.27 54.61,1.27
3D body "PLS-1.step": height 8.44, standoff -3, extent 54.61,-1.27 57.15,1.27
3D body "PLS-1.step": height 8.44, standoff -3, extent 57.15,-1.27 59.69,1.27
3D body "PLS-1.step": height 8.44, standoff -3, extent 59.69,-1.27 62.23,1.27
3D body "PLS-1.step": height 8.44, standoff -3, extent 62.23,-1.27 64.77,1.27
3D body "PLS-1.step": height 8.44, standoff -3, extent 64.77,-1.27 67.31,1.27
3D body "PLS-1.step": height 8.44, standoff -3, extent 67.31,-1.27 69.85,1.27
3D body "PLS-1.step": height 8.44, standoff -3, extent 69.85,-1.27 72.39,1.27
3D body "PLS-1.step": height 8.44, standoff -3, extent 72.39,-1.27 74.93,1.27
3D body "PLS-1.step": height 8.44, standoff -3, extent 74.93,-1.27 77.47,1.27
3D body "PLS-1.step": height 8.44, standoff -3, extent 77.47,-1.27 80.01,1.27
3D body "PLS-1.step": height 8.44, standoff -3, extent 80.01,-1.27 82.55,1.27
3D body "PLS-1.step": height 8.44, standoff -3, extent 82.55,-1.27 85.09,1.27
3D body "PLS-1.step": height 8.44, standoff -3, extent 85.09,-1.27 87.63,1.27

## PLS-40-2 [mm] "Connector; Header; 1x40 Position"
height 6
pads (40):
  rect 1.2x1.2 hole 0.75: 1(0,0)
  round 1.2 hole 0.75: 2(0,2) 3(0,4) 4(0,6) 5(0,8)
  round 1.2 hole 0.75 unplated: 6(0,10) 7(0,12) 8(0,14) 9(0,16) 10(0,18) 11(0,20) 12(0,22) 13(0,24) 14(0,26) 15(0,28) 16(0,30) 17(0,32) 18(0,34) 19(0,36) 20(0,38) 21(0,40) 22(0,42) 23(0,44) 24(0,46) 25(0,48) 26(0,50) 27(0,52) 28(0,54) 29(0,56) 30(0,58) 31(0,60) 32(0,62) 33(0,64) 34(0,66) 35(0,68) 36(0,70) 37(0,72) 38(0,74) 39(0,76) 40(0,78)
Top Overlay:
  lines w0.2: -1.2,-1 -1.2,79 1.25,79 1.25,-1 -1.2,-1
3D body "pls-2mm.stp": height 5.5, standoff -2.5, extent -1.2,77 1.2,79
3D body "pls-2mm.stp": height 5.5, standoff -2.5, extent -1.2,75 1.2,77
3D body "pls-2mm.stp": height 5.5, standoff -2.5, extent -1.2,73 1.2,75
3D body "pls-2mm.stp": height 5.5, standoff -2.5, extent -1.2,71 1.2,73
3D body "pls-2mm.stp": height 5.5, standoff -2.5, extent -1.2,69 1.2,71
3D body "pls-2mm.stp": height 5.5, standoff -2.5, extent -1.2,67 1.2,69
3D body "pls-2mm.stp": height 5.5, standoff -2.5, extent -1.2,65 1.2,67
3D body "pls-2mm.stp": height 5.5, standoff -2.5, extent -1.2,63 1.2,65
3D body "pls-2mm.stp": height 5.5, standoff -2.5, extent -1.2,61 1.2,63
3D body "pls-2mm.stp": height 5.5, standoff -2.5, extent -1.2,59 1.2,61
3D body "pls-2mm.stp": height 5.5, standoff -2.5, extent -1.2,57 1.2,59
3D body "pls-2mm.stp": height 5.5, standoff -2.5, extent -1.2,55 1.2,57
3D body "pls-2mm.stp": height 5.5, standoff -2.5, extent -1.2,53 1.2,55
3D body "pls-2mm.stp": height 5.5, standoff -2.5, extent -1.2,51 1.2,53
3D body "pls-2mm.stp": height 5.5, standoff -2.5, extent -1.2,49 1.2,51
3D body "pls-2mm.stp": height 5.5, standoff -2.5, extent -1.2,47 1.2,49
3D body "pls-2mm.stp": height 5.5, standoff -2.5, extent -1.2,45 1.2,47
3D body "pls-2mm.stp": height 5.5, standoff -2.5, extent -1.2,43 1.2,45
3D body "pls-2mm.stp": height 5.5, standoff -2.5, extent -1.2,41 1.2,43
3D body "pls-2mm.stp": height 5.5, standoff -2.5, extent -1.2,39 1.2,41
3D body "pls-2mm.stp": height 5.5, standoff -2.5, extent -1.2,37 1.2,39
3D body "pls-2mm.stp": height 5.5, standoff -2.5, extent -1.2,35 1.2,37
3D body "pls-2mm.stp": height 5.5, standoff -2.5, extent -1.2,33 1.2,35
3D body "pls-2mm.stp": height 5.5, standoff -2.5, extent -1.2,31 1.2,33
3D body "pls-2mm.stp": height 5.5, standoff -2.5, extent -1.2,29 1.2,31
3D body "pls-2mm.stp": height 5.5, standoff -2.5, extent -1.2,27 1.2,29
3D body "pls-2mm.stp": height 5.5, standoff -2.5, extent -1.2,25 1.2,27
3D body "pls-2mm.stp": height 5.5, standoff -2.5, extent -1.2,23 1.2,25
3D body "pls-2mm.stp": height 5.5, standoff -2.5, extent -1.2,21 1.2,23
3D body "pls-2mm.stp": height 5.5, standoff -2.5, extent -1.2,19 1.2,21
3D body "pls-2mm.stp": height 5.5, standoff -2.5, extent -1.2,17 1.2,19
3D body "pls-2mm.stp": height 5.5, standoff -2.5, extent -1.2,15 1.2,17
3D body "pls-2mm.stp": height 5.5, standoff -2.5, extent -1.2,13 1.2,15
3D body "pls-2mm.stp": height 5.5, standoff -2.5, extent -1.2,11 1.2,13
3D body "pls-2mm.stp": height 5.5, standoff -2.5, extent -1.2,9 1.2,11
3D body "pls-2mm.stp": height 5.5, standoff -2.5, extent -1.2,-1 1.2,1
3D body "pls-2mm.stp": height 5.5, standoff -2.5, extent -1.2,1 1.2,3
3D body "pls-2mm.stp": height 5.5, standoff -2.5, extent -1.2,3 1.2,5
3D body "pls-2mm.stp": height 5.5, standoff -2.5, extent -1.2,5 1.2,7
3D body "pls-2mm.stp": height 5.5, standoff -2.5, extent -1.2,7 1.2,9

## PLS-40-3D [mm] "Connector; Header; 40 Position"
height 7.5
pads (40):
  rect 1.5x1.5 hole 0.9: 1(0,0)
  round 1.5 hole 0.9: 2(2.54,0) 3(5.08,0) 4(7.62,0) 5(10.16,0) 6(12.7,0) 7(15.24,0) 8(17.78,0) 9(20.32,0) 10(22.86,0) 11(25.4,0) 12(27.94,0) 13(30.48,0) 14(33.02,0) 15(35.56,0) 16(38.1,0) 17(40.64,0) 18(43.18,0) 19(45.72,0) 20(48.26,0) 21(50.8,0) 22(53.34,0) 23(55.88,0) 24(58.42,0) 25(60.96,0) 26(63.5,0) 27(66.04,0) 28(68.58,0) 29(71.12,0) 30(73.66,0) 31(76.2,0) 32(78.74,0) 33(81.28,0) 34(83.82,0) 35(86.36,0) 36(88.9,0) 37(91.44,0) 38(93.98,0) 39(96.52,0) 40(99.06,0)
Top Overlay:
  lines w0.2: -1.27,-1.27 -1.27,1.27 100.33,1.27 100.33,-1.27 -1.27,-1.27
3D body "PLS-1.step": height 8.44, standoff -3, extent 97.79,-1.27 100.33,1.27
3D body "PLS-1.step": height 8.44, standoff -3, extent 95.25,-1.27 97.79,1.27
3D body "PLS-1.step": height 8.44, standoff -3, extent 92.71,-1.27 95.25,1.27
3D body "PLS-1.step": height 8.44, standoff -3, extent 90.17,-1.27 92.71,1.27
3D body "PLS-1.step": height 8.44, standoff -3, extent 87.63,-1.27 90.17,1.27
3D body "PLS-1.step": height 8.44, standoff -3, extent 85.09,-1.27 87.63,1.27
3D body "PLS-1.step": height 8.44, standoff -3, extent 82.55,-1.27 85.09,1.27
3D body "PLS-1.step": height 8.44, standoff -3, extent 80.01,-1.27 82.55,1.27
3D body "PLS-1.step": height 8.44, standoff -3, extent 77.47,-1.27 80.01,1.27
3D body "PLS-1.step": height 8.44, standoff -3, extent 74.93,-1.27 77.47,1.27
3D body "PLS-1.step": height 8.44, standoff -3, extent 72.39,-1.27 74.93,1.27
3D body "PLS-1.step": height 8.44, standoff -3, extent 69.85,-1.27 72.39,1.27
3D body "PLS-1.step": height 8.44, standoff -3, extent 67.31,-1.27 69.85,1.27
3D body "PLS-1.step": height 8.44, standoff -3, extent 64.77,-1.27 67.31,1.27
3D body "PLS-1.step": height 8.44, standoff -3, extent 62.23,-1.27 64.77,1.27
3D body "PLS-1.step": height 8.44, standoff -3, extent 59.69,-1.27 62.23,1.27
3D body "PLS-1.step": height 8.44, standoff -3, extent 57.15,-1.27 59.69,1.27
3D body "PLS-1.step": height 8.44, standoff -3, extent 54.61,-1.27 57.15,1.27
3D body "PLS-1.step": height 8.44, standoff -3, extent 52.07,-1.27 54.61,1.27
3D body "PLS-1.step": height 8.44, standoff -3, extent 49.53,-1.27 52.07,1.27
3D body "PLS-1.step": height 8.44, standoff -3, extent 46.99,-1.27 49.53,1.27
3D body "PLS-1.step": height 8.44, standoff -3, extent 44.45,-1.27 46.99,1.27
3D body "PLS-1.step": height 8.44, standoff -3, extent 41.91,-1.27 44.45,1.27
3D body "PLS-1.step": height 8.44, standoff -3, extent 39.37,-1.27 41.91,1.27
3D body "PLS-1.step": height 8.44, standoff -3, extent 36.83,-1.27 39.37,1.27
3D body "PLS-1.step": height 8.44, standoff -3, extent 34.29,-1.27 36.83,1.27
3D body "PLS-1.step": height 8.44, standoff -3, extent 31.75,-1.27 34.29,1.27
3D body "PLS-1.step": height 8.44, standoff -3, extent 29.21,-1.27 31.75,1.27
3D body "PLS-1.step": height 8.44, standoff -3, extent 26.67,-1.27 29.21,1.27
3D body "PLS-1.step": height 8.44, standoff -3, extent 24.13,-1.27 26.67,1.27
3D body "PLS-1.step": height 8.44, standoff -3, extent 21.59,-1.27 24.13,1.27
3D body "PLS-1.step": height 8.44, standoff -3, extent 19.05,-1.27 21.59,1.27
3D body "PLS-1.step": height 8.44, standoff -3, extent 16.51,-1.27 19.05,1.27
3D body "PLS-1.step": height 8.44, standoff -3, extent 13.97,-1.27 16.51,1.27
3D body "PLS-1.step": height 8.44, standoff -3, extent 11.43,-1.27 13.97,1.27
3D body "PLS-1.step": height 8.44, standoff -3, extent 8.89,-1.27 11.43,1.27
3D body "PLS-1.step": height 8.44, standoff -3, extent 6.35,-1.27 8.89,1.27
3D body "PLS-1.step": height 8.44, standoff -3, extent 3.81,-1.27 6.35,1.27
3D body "PLS-1.step": height 8.44, standoff -3, extent 1.27,-1.27 3.81,1.27
3D body "PLS-1.step": height 8.44, standoff -3, extent -1.27,-1.27 1.27,1.27

## PMW3360 [mm] "OproSesor"

## power_wire_4_2 [mm] "PCB hole for connect power cable"
pads (8):
  rect 3x3 hole 1.9: 1(-2,2) 2(1,2) 3(-2,-1) 4(1,-1) 5(-2,-5) 6(1,-5) 7(-2,-8) 8(1,-8)

## PTQ 0,3/ 2-2,5 THR R32 / 1702610 [mm]
height 5
pads (3):
  rrect50% 2x2 hole 1.1: 1(2.5,6.9) 2(0,9.4)
  rrect50% 0x0 hole 1.5 unplated: MNT(0,0)
Top Overlay:
  drawing of 1873 lines, arcs and shapes, not listed
3D body "pxc_1702610_01_PTQ-0-3-2-2-5-THR-R32_3D.stp": height 8, standoff -2, extent -2.25,-0.618 4.75,16.918

## PTSM 0,5/ 1-2,5-H SMD WH L R24 /1840035 [mm] "PTSM 0,5/ 1-2,5-H SMD WH L R24 /1840035"
pads (2):
  rrect10% 2.3x5.6 smd: 0(-3.85,-6.6)
  rrect10% 1.4x3.4 smd: 1(-1.25,0)
Top Overlay:
  lines w0.2: -3.25,-9.75 -3.25,-10.375 0.762,-10.375 0.762,-0.772 0.012,-0.772 ; -3.25,-3.5 -3.25,-0.75 -2.5,-0.75
3D body "pxc_1840035_00_01_PTSM-0-5-1-2-5-H-SMD-WH-L-R24_3D.stp": height 5.1, standoff -0.02, extent -4.675,-10.3 0.275,0.7

## PTSM 0,5/ 2-2,5-H SMD R24 [mm]
pads (4):
  rrect10% 2.3x5.6 smd: 0(-3.85,-6.6) 0(3.85,-6.6)
  rrect10% 1.4x3.4 smd: 1(-1.25,0) 2(1.25,0)
Top Overlay:
  lines w0.2: -5,-9.75 5,-9.75 ; -3.25,-3.5 -3.25,-0.75 -2.5,-0.75 ; 2.5,-0.75 3.25,-0.75 3.25,-3.5
3D body "1702473.stp": height 5, standoff 0, extent -4.7,-10.2 4.7,0.8